# Altium footprint library Maxwell_LIB.PcbLib: 143 footprints (part 9 of 9)
Each footprint in its own frame and in the unit in brackets; x right, y up, seen from the top. Pads: shape width x height; smd on the part's side, far side on the other; paste and mask are expansions set on the pad; w line width, h text height; cw(c..) or ccw(c..) is an arc to the next point about the centre after c.
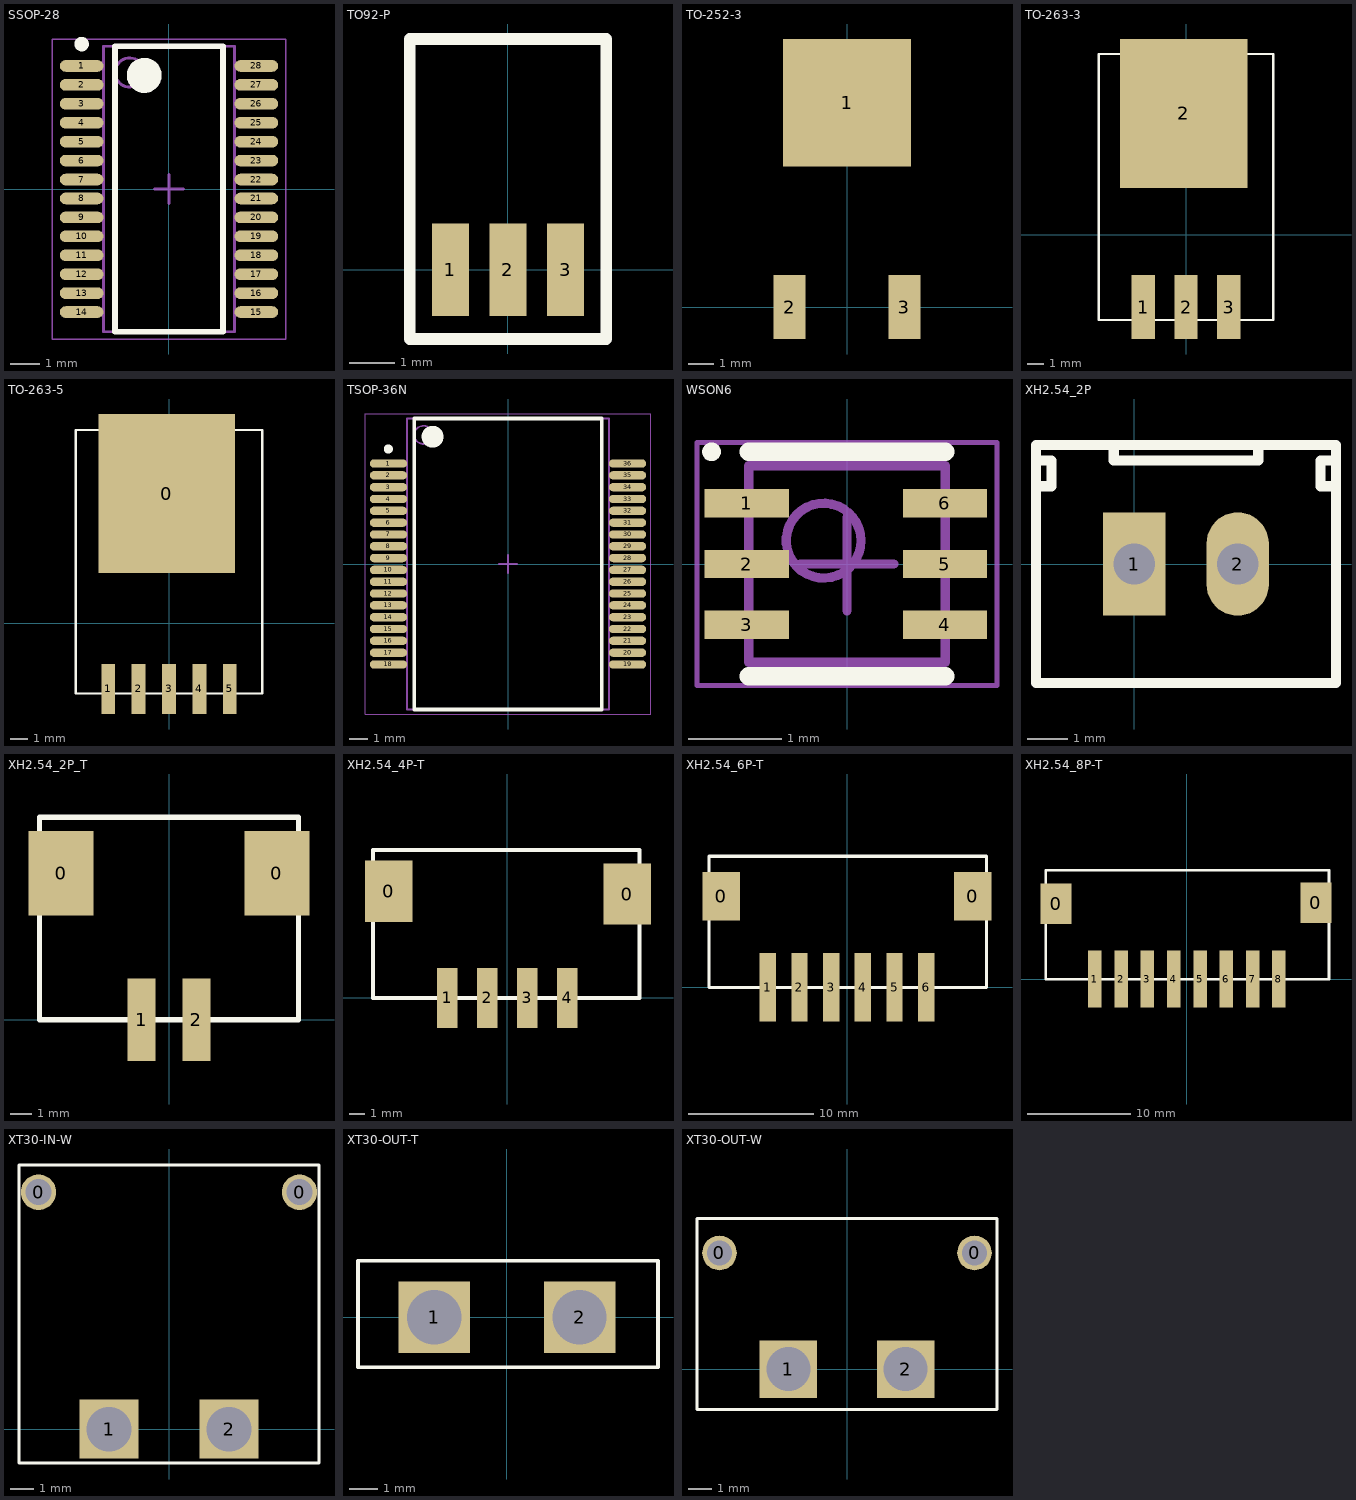
[diagram p8: the footprints below, top view; thin cyan lines are the x and y axes]

## SSOP-28 [mm] "TSOP, 28-Leads, Body 9.75x4.40mm, Pitch 0.65mm, IPC Medium Density"
height 1
pads (28):
  oval 1.5x0.4 smd: 1(-3,4.225) 2(-3,3.575) 3(-3,2.925) 4(-3,2.275) 5(-3,1.625) 6(-3,0.975) 7(-3,0.325) 8(-3,-0.325) 9(-3,-0.975) 10(-3,-1.625) 11(-3,-2.275) 12(-3,-2.925) 13(-3,-3.575) 14(-3,-4.225) 15(3,-4.225) 16(3,-3.575) 17(3,-2.925) 18(3,-2.275) 19(3,-1.625) 20(3,-0.975) 21(3,-0.325) 22(3,0.325) 23(3,0.975) 24(3,1.625) 25(3,2.275) 26(3,2.925) 27(3,3.575) 28(3,4.225)
Top Overlay:
  circle w0.25: c-3,4.975 r0.125
  circle w0.6: c-0.85,3.9 r0.3
  lines w0.2: -1.85,-4.9 -1.85,4.9 1.85,4.9 1.85,-4.9 -1.85,-4.9
Mechanical 13:
  circle w0.1: c-1.35,4 r0.5
  lines w0.1: -2.25,-4.9 -2.25,4.9 2.25,4.9 2.25,-4.9 -2.25,-4.9
Mechanical 15:
  lines w0.05: -4,-5.15 -4,5.15 4,5.15 4,-5.15 -4,-5.15
  lines w0.1: -0.5,0 0.5,0 ; 0,-0.5 0,0.5
3D body "TSSOP-28.STEP": height 0.92, standoff -0.07, extent -3.251,-4.799 3.149,4.901

## TO92-P [mil]
pads (3):
  rect 32x80 smd: 1(-50,0) 2(0,0) 3(50,0)
Top Overlay:
  lines w10: -85,-60 85,-60 85,200 -85,200 -85,-60

## TO-252-3 [mil]
pads (3):
  rect 200x200 smd: 1(0,320)
  rect 50x100 smd: 2(-90,0) 3(90,0)
3D body "User Library-TO-252-3.STEP": height 94.88, standoff -0.04, extent -131.88,-10.03 131.9,397.54

## TO-263-3 [mil]
pads (4):
  rect 55x150 smd: 1(-100,-170) 2(0,-170) 3(100,-170)
  rect 300x350 smd: 2(-5,285)
Top Overlay:
  lines w5: -205,-200 -205,425 205,425 205,-200 -205,-200
3D body "User Library-TO-263-3.STEP": height 181.1, standoff 0, extent -202.75,-188.97 202.76,405.52

## TO-263-5 [mil]
pads (6):
  rect 300x350 smd: 0(-5,285)
  rect 30x110 smd: 1(-134,-145) 2(-67,-145) 3(0,-145) 4(67,-145) 5(134,-145)
Top Overlay:
  lines w5: -205,-155 -205,425 205,425 205,-155 -205,-155
3D body "User Library-TO-263-5.STEP": height 179.53, standoff 0, extent -200,-151.79 200,399.98

## TSOP-36N [mm] "TSOP, 36-Leads, Body 15.90x11.00mm, Pitch 0.65mm, IPC Medium Density"
height 1
pads (36):
  oval 2.05x0.46 smd: 1(-6.575,5.525) 2(-6.575,4.875) 3(-6.575,4.225) 4(-6.575,3.575) 5(-6.575,2.925) 6(-6.575,2.275) 7(-6.575,1.625) 8(-6.575,0.975) 9(-6.575,0.325) 10(-6.575,-0.325) 11(-6.575,-0.975) 12(-6.575,-1.625) 13(-6.575,-2.275) 14(-6.575,-2.925) 15(-6.575,-3.575) 16(-6.575,-4.225) 17(-6.575,-4.875) 18(-6.575,-5.525) 19(6.575,-5.525) 20(6.575,-4.875) 21(6.575,-4.225) 22(6.575,-3.575) 23(6.575,-2.925) 24(6.575,-2.275) 25(6.575,-1.625) 26(6.575,-0.975) 27(6.575,-0.325) 28(6.575,0.325) 29(6.575,0.975) 30(6.575,1.625) 31(6.575,2.275) 32(6.575,2.925) 33(6.575,3.575) 34(6.575,4.225) 35(6.575,4.875) 36(6.575,5.525)
Top Overlay:
  circle w0.25: c-6.575,6.325 r0.125
  circle w0.6: c-4.15,7 r0.3
  lines w0.2: -5.15,-8 -5.15,8 5.15,8 5.15,-8 -5.15,-8
Mechanical 13:
  circle w0.1: c-4.65,7.1 r0.5
  lines w0.1: -5.55,-8 -5.55,8 5.55,8 5.55,-8 -5.55,-8
Mechanical 15:
  lines w0.05: -7.85,-8.25 -7.85,8.25 7.85,8.25 7.85,-8.25 -7.85,-8.25
  lines w0.1: -0.5,0 0.5,0 ; 0,-0.5 0,0.5
3D body "User Library-DRV8432.STEP": height 3.98, standoff -0.02, extent -7.174,-8.024 7.326,7.976

## WSON6 [mm] "SON, 6-Leads, Body 2.00x2.00mm, Pitch 0.65mm, Thermal Pad 0.00x0.00mm, IPC Medium Density"
height 2.65
pads (6):
  rect 0.9x0.3 smd: 1(-1.073,0.65) 2(-1.073,0) 3(-1.073,-0.65) 4(1.047,-0.65) 5(1.047,0) 6(1.047,0.65)
Top Overlay:
  circle w0.1: c-1.45,1.2 r0.05
  lines w0.2: -1.05,-1.2 1.05,-1.2 ; -1.05,1.2 1.05,1.2
Mechanical 13:
  circle w0.1: c-0.25,0.25 r0.4
  lines w0.1: -1.05,-1.05 -1.05,1.05 1.05,1.05 1.05,-1.05 -1.05,-1.05
Mechanical 15:
  lines w0.05: -1.605,-1.3 -1.605,1.3 1.605,1.3 1.605,-1.3 -1.605,-1.3
  lines w0.1: -0.5,0 0.5,0 ; 0,-0.5 0,0.5
3D body "User Library-wson6-drv.STEP": height 0.8, standoff 0, extent -1.01,-1 1.01,1

## XH2.54_2P [mil]
pads (2):
  rect 60x100 hole 40: 1(0,0)
  oval 60x100 hole 40: 2(100,0)
Top Overlay:
  lines w10: -95,75 -80,75 -80,100 -95,100 ; -20,115 -20,100 120,100 120,115 ; 135,-115 195,-115 ; 195,75 180,75 180,100 195,100 ; 195,-115 -95,-115 -95,115 195,115 195,-115
3D body "XH2.54-2p.STEP": height 275.59, standoff -157.48, extent -95.67,-113.35 195.67,115

## XH2.54_2P_T [mm]
pads (4):
  rect 3x3.9 smd: 0(-5,6.792) 0(5,6.792)
  rect 1.3x3.81 smd: 1(-1.27,0) 2(1.27,0)
Top Overlay:
  lines w0.254: -6,0 6,0 6,9.398 -6,9.398 -6,0
3D body "User Library-XHB-2_54-2P.stp": height 6.34, standoff -0.13, extent -4.94,-1.038 4.94,9.148

## XH2.54_4P-T [mm]
pads (6):
  rect 3x3.9 smd: 0(-7.54,6.792) 0(7.62,6.604)
  rect 1.3x3.81 smd: 1(-3.81,0) 2(-1.27,0) 3(1.27,0) 4(3.81,0)
Top Overlay:
  lines w0.254: -8.54,0 -8.54,9.398 8.382,9.398 8.382,0 -8.54,0
3D body "User Library-XHB-2_54-4P.stp": height 6.44, standoff -0.03, extent -7.5,-0.53 7.5,9.656

## XH2.54_6P-T [mm]
pads (8):
  rect 3x3.9 smd: 0(-10.08,7.3) 0(10.08,7.3)
  rect 1.3x5.5 smd: 1(-6.35,0) 2(-3.81,0) 3(-1.27,0) 4(1.27,0) 5(3.81,0) 6(6.35,0)
Top Overlay:
  lines w0.254: -11.08,0 -10.414,0 -5.08,0 0.279,0 11.176,0 11.176,10.516 -11.08,10.516 -11.08,10.135 -11.08,0
3D body "User Library-XHB-2_54-6P.stp": height 6.34, standoff -0.13, extent -10.06,0 10.06,10.186

## XH2.54_8P-T [mm]
pads (10):
  rect 3x3.9 smd: 0(-12.62,7.3) 0(12.446,7.366)
  rect 1.3x5.5 smd: 1(-8.89,0) 2(-6.35,0) 3(-3.81,0) 4(-1.27,0) 5(1.27,0) 6(3.81,0) 7(6.35,0) 8(8.89,0)
Top Overlay:
  lines w0.254: -13.62,0 -12.954,0 -7.62,0 -2.261,0 13.716,0 13.716,10.516 -13.62,10.516 -13.62,10.135 -13.62,0
3D body "User Library-XHB-2_54-8P.stp": height 6.34, standoff -0.13, extent -12.62,0 12.62,10.186

## XT30-IN-W [mm]
pads (4):
  round 1.5 hole 1.1: 0(-5.524,10.033) 0(5.524,10.033)
  rect 2.5x2.5 hole 1.9: 1(-2.54,0) 2(2.54,0)
Top Overlay:
  lines w0.127: -6.35,-1.422 6.35,-1.422 6.35,11.176 -6.35,11.176 -6.35,-1.422
3D body "User Library-XT30PW-M.STEP": height 5, standoff -2, extent -6.624,-0.992 6.676,12.958

## XT30-OUT-T [mm]
pads (2):
  rect 2.5x2.5 hole 1.9: 1(-2.54,0) 2(2.54,0)
Top Overlay:
  lines w0.127: -5.207,-1.753 -5.207,1.981 5.283,1.981 5.283,-1.753 -5.207,-1.753
3D body "User Library-XT30UPB-F-2.STEP": height 3.3, standoff -1.9, extent -5.1,-0.984 5.1,10.416

## XT30-OUT-W [mm]
pads (4):
  round 1.5 hole 1.1: 0(-5.525,5.033) 0(5.525,5.033)
  rect 2.5x2.5 hole 1.9: 1(-2.54,0) 2(2.54,0)
Top Overlay:
  lines w0.127: -6.5,-1.753 6.5,-1.753 6.5,6.528 -6.5,6.528 -6.5,-1.753
3D body "User Library-XT30PW-F.STEP": height 5, standoff -2, extent -6.675,-0.933 6.625,13.967